# Altium footprint library mmyLibrary.PcbLib: 231 footprints (part 6 of 15)
Each footprint in its own frame and in the unit in brackets; x right, y up, seen from the top. Pads: shape width x height; smd on the part's side, far side on the other; paste and mask are expansions set on the pad; w line width, h text height; cw(c..) or ccw(c..) is an arc to the next point about the centre after c.
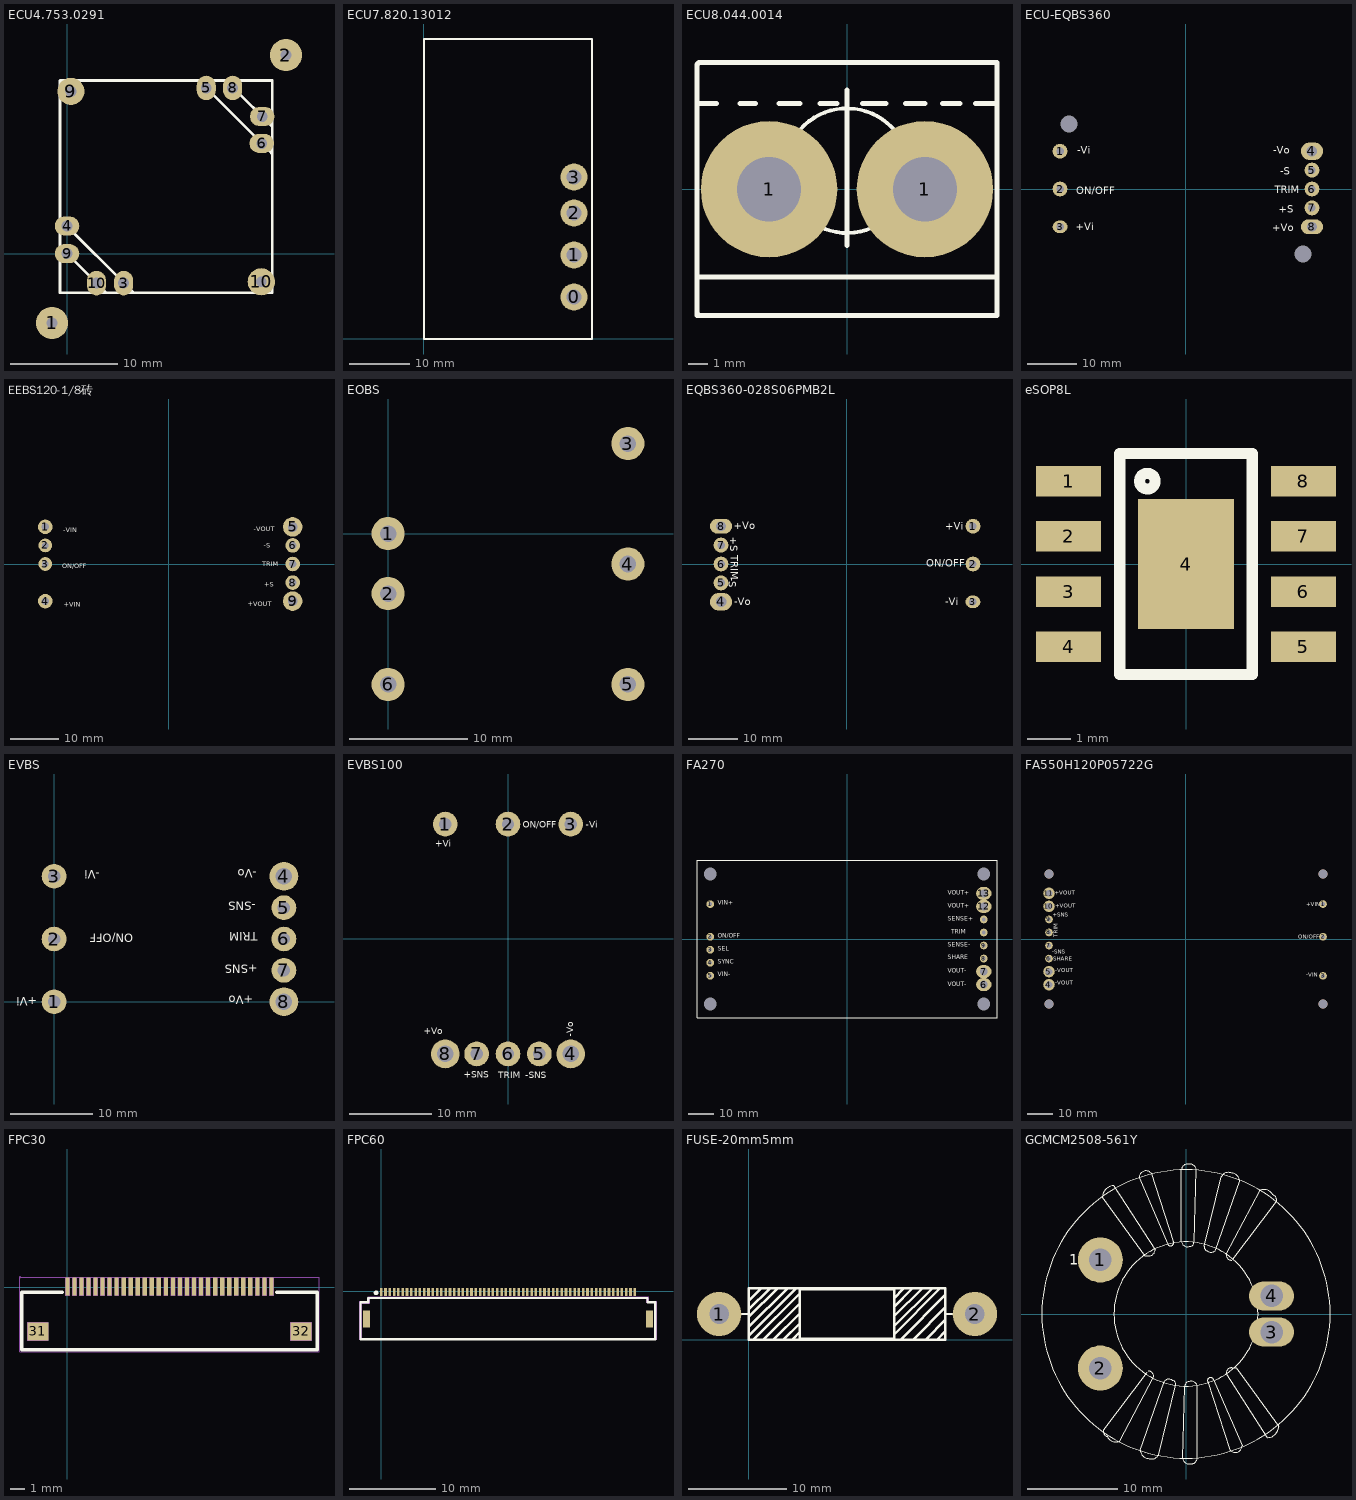
[diagram p5: the footprints below, top view; thin cyan lines are the x and y axes]

## ECU4.753.0291 [mil]
pads (12):
  round 118.11 hole 39.37: 1(-55,-255) 2(805,730)
  oval 70x90 hole 40: 3(208.33,-108.58) 5(511.98,609.13) 8(609.13,609.13) 10(108.5,-108.58)
  oval 90x70 hole 40: 4(0,101.6) 6(715.9,405.25) 7(717.67,504.12) 9(0,0)
  round 100 hole 40: 9(14.29,596.42) 10(714.29,-103.58)
Top Overlay:
  lines w10: -25.71,-24.53 -25.71,-23.98 ; -25.55,126.26 244.29,-143.58 244.53,-143.58 ; -23.98,23.9 143.5,-143.58 143.74,-143.58 ; 133.11,-143.58 133.11,-141.85 ; 484.73,636.42 751.19,369.96 754.29,369.96 ; 610.89,610.89 751.04,470.75 752.95,470.75 754.29,470.75 ; 752.8,373.5 754.29,373.5 ; 754.29,408.7 754.29,412.48 ; -25.71,-143.58 754.29,-143.58 754.29,636.42 -25.71,636.42 -25.71,-143.58

## ECU7.820.13012 [mm] "比拟在ECU7.820.12296中所占位置"
pads (4):
  round 4.5 hole 2.5: 0(25,7) 1(25,14) 2(25,21) 3(25,27)
Top Overlay:
  lines w0.254: 0,0 0,50 28,50 28,0 0,0

## ECU8.044.0014 [mm]
pads (2):
  round 7 hole 3.3: 1(-4,0) 1(4,0)
Top Overlay:
  circle w0.2: c0,0.95 r3.2
  lines w0.254: -7.7,-6.384 -7.6,-6.484 7.7,-6.484 ; -7.7,-4.5 7.7,-4.5 ; -7.7,-0.2 -7.7,-6.484 ; -7.7,3.8 -7.7,6.4 -7.6,6.5 7.7,6.5 7.7,-6.484 ; -7.7,4.4 -6.7,4.4 ; -7.7,4.5 -7.7,-6.484 ; -5.5,4.4 -4.7,4.4 ; -3.5,4.4 -2.4,4.4 ; -1.4,4.4 -0.5,4.4 ; 0,-2.9 0,5.1 ; 0.8,4.4 2,4.4 ; 3,4.4 4,4.4 ; 4.9,4.4 5.8,4.4 ; 6.6,4.4 7.7,4.4 ; 7.7,4.5 7.7,-6.484 ; -7.7,-6.484 7.7,-6.484

## ECU-EQBS360 [mm]
pads (10):
  round 0 hole 3.5: 0(-23.6,13.1) 0(23.6,-13.1)
  round 3 hole 1.5: 1(-25.4,7.62) 2(-25.4,0) 5(25.4,3.81) 6(25.4,0) 7(25.4,-3.81)
  oval 3x2.5 hole 1.5: 3(-25.4,-7.62)
  oval 4.5x3.5 hole 2.1: 4(25.4,7.62)
  oval 4.5x3 hole 2: 8(25.4,-7.62)
Top Overlay:
  text "+Vi" at -22.187,-8.34 h1.5
  text "+Vo" at 17.409,-8.494 h1.5
  text "+S" at 18.669,-4.826 h1.5
  text "TRIM" at 17.869,-0.877 h1.5
  text "-S" at 19.05,2.921 h1.5
  text "-Vo" at 17.636,7.067 h1.5
  text "-Vi" at -21.933,7.067 h1.5
  text "ON/OFF" at -22.098,-1.016 h1.5
Bottom Overlay:
  lines w0.254: -30.25,-19.4 30.25,-19.4 30.25,19.4 -30.25,19.4 -30.25,-19.4
  text "+Vi" at -18.687,-8.34 h1.5
  text "ON/OFF" at -15.621,-0.889 h1.5
  text "-Vi" at -18.433,7.167 h1.5
  text "-Vo" at 21.736,7.067 h1.5
  text "-S" at 21.679,2.866 h1.5
  text "TRIM" at 21.99,-0.727 h1.5
  text "+S" at 21.579,-4.801 h1.5
  text "+Vo" at 21.509,-8.494 h1.5

## EEBS120-1/8砖 [mm]
pads (9):
  round 3 hole 1.5: 1(-25.4,7.62) 4(-25.4,-7.62) 6(25.4,3.81) 7(25.4,0) 8(25.4,-3.81)
  round 2.8 hole 1.4: 2(-25.4,3.81) 3(-25.4,0)
  round 4 hole 2: 5(25.4,7.62) 9(25.4,-7.62)
Top Overlay:
  text "+VOUT" at 16.129,-8.636 h1
  text "-VOUT" at 17.399,6.731 h1
  text "-S" at 19.431,3.302 h1
  text "TRIM" at 19.177,-0.508 h1
  text "ON/OFF" at -21.885,-0.855 h1
  text "+VIN" at -21.653,-8.785 h1
  text "-VIN" at -21.725,6.565 h1
  text "+S" at 19.558,-4.699 h1
Bottom Overlay:
  lines w0.254: -30.8,-13.3 30.8,-13.3 30.8,13.3 -30.8,13.3 -30.8,-13.3
  text "+VOUT" at 21.756,-8.634 h1
  text "-VOUT" at 22.132,6.779 h1
  text "-S" at 21.351,3.261 h1
  text "TRIM" at 21.968,-0.671 h1
  text "ON/OFF" at -17.145,-0.762 h1
  text "-VIN" at -19.685,6.731 h1
  text "+VIN" at -18.415,-9.017 h1
  text "+S" at 21.46,-4.484 h1

## EOBS [mm]
pads (6):
  round 2.8 hole 1.4: 1(0,0) 2(0,-5.08) 3(20.3,7.62) 4(20.3,-2.58) 5(20.3,-12.78) 6(0,-12.78)
Bottom Overlay:
  lines w0.254: -2.55,-15.28 22.85,-15.28 22.85,10.12 -2.55,10.12 -2.55,-15.28
  text "-VIN" at 2.35,-4.58 h1
  text "ON/OFF" at 2.025,-12.18 h1
  text "+VIN" at 2.25,0.795 h1
  text "TRIM" at 14.075,-1.83 h1
  text "-VO" at 13.675,-12.23 h1
  text "+VO" at 13.975,8.47 h1

## EQBS360-028S06PMB2L [mm]
pads (8):
  round 3 hole 1.5: 1(25.4,7.62) 2(25.4,0) 5(-25.4,-3.81) 6(-25.4,0) 7(-25.4,3.81)
  oval 3x2.5 hole 1.5: 3(25.4,-7.62)
  oval 4.5x3.5 hole 2.1: 4(-25.4,-7.62)
  oval 4.5x3 hole 2: 8(-25.4,7.62)
Top Overlay:
  text "ON/OFF" at 15.95,-0.6 h1.5
  text "-Vi" at 19.85,-8.3 h1.5
  text "-Vo" at -22.75,-8.3 h1.5
  text "-S" at -23.813,-2.8 h1.5
  text "TRIM" at -23.413,1.8 h1.5
  text "+S" at -23.513,5.5 h1.5
  text "+Vo" at -22.85,7 h1.5
  text "+Vi" at 19.85,6.9 h1.5
Bottom Overlay:
  lines w0.254: -30.25,-19.4 -30.25,19.4 30.25,19.4 30.25,-19.4 -30.25,-19.4
  text "+Vo" at -18.75,7 h1.5
  text "+S" at -19.95,3.2 h1.5
  text "TRIM" at -18.65,-0.6 h1.5
  text "-S" at -19.85,-4.5 h1.5
  text "-Vo" at -18.65,-8.3 h1.5
  text "-Vi" at 23.35,-8.2 h1.5
  text "ON/OFF" at 23.25,-0.6 h1.5
  text "+Vi" at 23.35,6.9 h1.5

## eSOP8L [mm]
pads (9):
  rect 1.5x0.7 smd: 1(-2.7,1.905) 2(-2.7,0.635) 3(-2.7,-0.635) 4(-2.7,-1.905) 5(2.7,-1.905) 6(2.7,-0.635) 7(2.7,0.635) 8(2.7,1.905)
  rect 2.2x3 smd: 4(0,0)
Top Overlay:
  circle w0.254: c-0.889,1.905 r0.18
  lines w0.254: -1.524,-2.54 -1.524,2.54 1.524,2.54 1.524,-2.54 -1.524,-2.54

## EVBS [mm]
pads (8):
  round 3 hole 1.5: 1(0,0) 2(0,7.62) 3(0,15.24) 5(27.94,11.43) 6(27.94,7.62) 7(27.94,3.81)
  round 3.5 hole 2: 4(27.94,15.24) 8(27.94,0)
Top Overlay:
  text "+Vi" at -2.03,0.55 h1
  text "+Vo" at 24.2,0.72 h1
  text "+SNS" at 24.75,4.48 h1
  text "TRIM" at 24.73,8.42 h1
  text "-SNS" at 24.52,12.17 h1
  text "-Vo" at 24.65,16.11 h1
  text "ON/OFF" at 9.635,8.26 h1
  text "-Vi" at 5.535,15.96 h1
Bottom Overlay:
  lines w0.254: -4.265,-5.54 -4.265,20.78 32.205,20.78 32.205,-5.54 -4.265,-5.54
  text "-Vi" at 2.135,15.96 h1
  text "ON/OFF" at 2.135,8.26 h1
  text "+Vi" at 2.035,0.76 h1
  text "-Vo" at 21.635,15.96 h1
  text "-SNS" at 20.435,12.16 h1
  text "TRIM" at 21.735,8.36 h1
  text "+SNS" at 20.435,4.56 h1
  text "+Vo" at 21.535,0.86 h1

## EVBS100 [mm]
pads (8):
  round 3 hole 1.5: 1(-7.62,13.97) 2(0,13.97) 3(7.62,13.97) 5(3.81,-13.97) 6(0,-13.97) 7(-3.81,-13.97)
  round 3.5 hole 2: 4(7.62,-13.97) 8(-7.62,-13.97)
Top Overlay:
  text "-Vi" at 9.432,13.502 h0.8
  text "ON/OFF" at 1.812,13.502 h0.8
  text "-Vo" at 7.908,-11.898 h0.8
  text "-SNS" at 2.127,-16.905 h0.8
  text "TRIM" at -1.175,-16.956 h0.8
  text "+SNS" at -5.366,-16.854 h0.8
  text "+Vo" at -10.243,-11.571 h0.8
  text "+Vi" at -8.856,11.216 h0.8
Bottom Overlay:
  lines w0.254: -13.16,-18.235 -13.16,18.235 13.16,18.235 13.16,-18.235 -13.16,-18.235
  text "+Vo" at -6.28,-11.419 h0.8
  text "+SNS" at -2.318,-11.698 h0.8
  text "TRIM" at 1.05,-11.39 h0.8
  text "-SNS" at 5.368,-11.39 h0.8
  text "-Vo" at 8.67,-11.39 h0.8
  text "+Vi" at -6.57,10.962 h0.8
  text "ON/OFF" at 1.558,10.962 h0.8
  text "-Vi" at 8.67,10.962 h0.8

## FA270 [mm]
pads (17):
  round 0 hole 5: 0(-53.34,25.4) 1(-53.34,-25.4) 2(53.34,-25.4) 3(53.34,25.4)
  round 3 hole 1.5: 1(-53.34,13.59) 2(-53.34,0.89) 3(-53.34,-4.19) 4(-53.34,-9.27) 5(-53.34,-14.35) 8(53.34,-7.62) 9(53.34,-2.54) 10(53.34,2.54) 11(53.34,7.62)
  oval 6x5 hole 3: 6(53.34,-17.78) 7(53.34,-12.7) 12(53.34,12.7) 13(53.34,17.78)
Top Overlay:
  lines w0.127: -58.5,-30.75 -58.5,30.75 58.5,30.75 58.5,-30.75 -58.5,-30.75
  text "VIN+" at -50.419,12.7 h3
  text "ON/OFF" at -50.419,0 h3
  text "SEL" at -50.419,-5.207 h3
  text "SYNC" at -50.419,-10.287 h3
  text "VIN-" at -50.419,-15.113 h3
  text "VOUT-" at 39.37,-19.05 h3
  text "VOUT-" at 39.37,-13.716 h3
  text "SHARE" at 39.37,-8.509 h3
  text "SENSE-" at 39.37,-3.556 h3
  text "TRIM" at 40.64,1.524 h3
  text "SENSE+" at 39.37,6.604 h3
  text "VOUT+" at 39.37,11.684 h3
  text "VOUT+" at 39.37,16.764 h3

## FA550H120P05722G [mm]
pads (11):
  round 3 hole 1.5: 1(53.34,13.59) 2(53.34,0.89) 3(53.34,-14.35) 6(-53.34,-7.62) 7(-53.34,-2.54) 8(-53.34,2.54) 9(-53.34,7.62)
  round 4.5 hole 2.6: 4(-53.34,-17.78) 5(-53.34,-12.7) 10(-53.34,12.7) 11(-53.34,17.78)
via 53.34,25.4 diameter 3.5 hole 3.5
via 53.34,-25.4 diameter 3.5 hole 3.5
via -53.34,25.4 diameter 3.5 hole 3.5
via -53.34,-25.4 diameter 3.5 hole 3.5
Top Overlay:
  text "ON/OFF" at 43.795,0.007 h1.5
  text "+VOUT" at -51.074,17.279 h1.5
  text "+SNS" at -51.836,8.643 h1.5
  text "TRIM" at -49.931,0.642 h1.5
  text "-SNS" at -52.09,-5.708 h1.5
  text "-VOUT" at -50.947,-17.9 h1.5
  text "-VIN" at 46.843,-14.725 h1.5
  text "+VIN" at 46.843,12.834 h1.5
  text "SHARE" at -51.709,-8.375 h1.5
  text "-VOUT" at -50.947,-12.947 h1.5
  text "+VOUT" at -50.82,12.199 h1.5
Bottom Overlay:
  lines w0.254: -58.4,-30.6 -58.4,30.6 58.4,30.6 58.4,-30.6 -58.4,-30.6
  text "-VOUT" at -44.215,-17.901 h1.5
  text "-SNS" at -46.446,-5.581 h1.5
  text "TRIM" at -51.455,0.642 h1.5
  text "+SNS" at -46.375,8.643 h1.5
  text "+VOUT" at -44.216,17.152 h1.5
  text "-VIN" at 51.161,-14.852 h1.5
  text "+VIN" at 51.288,12.961 h1.5
  text "ON/OFF" at 51.415,0.007 h1.5
  text "SHARE" at -45.359,-8.375 h1.5
  text "-VOUT" at -44.215,-13.075 h1.5
  text "+VOUT" at -44.089,12.072 h1.5

## FPC30 [mil]
pads (32):
  rect 11.8x51.2 smd mask+2: 1(0.4,2.2) 2(20,2.2) 3(39.7,2.2) 4(59.3,2.2) 5(79,2.2) 6(98.7,2.2) 7(118.4,2.2) 8(138.1,2.2) 9(157.8,2.2) 10(177.5,2.2) 11(197.1,2.2) 12(216.8,2.2) 13(236.5,2.2) 14(256.2,2.2) 15(275.9,2.2) 16(295.6,2.2) 17(315.3,2.2) 18(334.9,2.2) 19(354.6,2.2) 20(374.3,2.2) 21(394,2.2) 22(413.8,2.2) 23(433.4,2.2) 24(453,2.2) 25(472.7,2.2) 26(492.4,2.2) 27(512.1,2.2) 28(531.8,2.2) 29(551.5,2.2) 30(571.2,2.2)
  rect 59.1x51.2 smd mask+2: 31(-82.3,-123.8) 32(653.9,-123.8)
Top Overlay:
  lines w10: -14.6,-13.6 -127.6,-13.6 -127.6,-175 699.2,-175 699.2,-13.6 586.2,-13.6
Mechanical 15:
  drawing of 37 lines, arcs and shapes, not listed

## FPC60 [mm]
pads (62):
  rect 0.3x0.9 smd: 1(0.01,-0.088) 2(0.51,-0.088) 3(1.01,-0.088) 4(1.51,-0.088) 5(2.01,-0.088) 6(2.51,-0.088) 7(3.01,-0.088) 8(3.51,-0.088) 9(4.01,-0.088) 10(4.51,-0.088) 11(5.01,-0.088) 12(5.51,-0.088) 13(6.01,-0.088) 14(6.51,-0.088) 15(7.01,-0.088) 16(7.51,-0.088) 17(8.01,-0.088) 18(8.51,-0.088) 19(9.01,-0.088) 20(9.51,-0.088) 21(10.01,-0.088) 22(10.51,-0.088) 23(11.01,-0.088) 24(11.51,-0.088) 25(12.01,-0.088) 26(12.51,-0.088) 27(13.01,-0.088) 28(13.51,-0.088) 29(14.01,-0.088) 30(14.51,-0.088) 31(15.01,-0.088) 32(15.51,-0.088) 33(16.01,-0.088) 34(16.51,-0.088) 35(17.01,-0.088) 36(17.51,-0.088) 37(18.01,-0.088) 38(18.51,-0.088) 39(19.01,-0.088) 40(19.51,-0.088) 41(20.01,-0.088) 42(20.51,-0.088) 43(21.01,-0.088) 44(21.51,-0.088) 45(22.01,-0.088) 46(22.51,-0.088) 47(23.01,-0.088) 48(23.51,-0.088) 49(24.01,-0.088) 50(24.51,-0.088) 51(25.01,-0.088) 52(25.51,-0.088) 53(26.01,-0.088) 54(26.51,-0.088) 55(27.01,-0.088) 56(27.51,-0.088) 57(28.01,-0.088) 58(28.51,-0.088) 59(29.01,-0.088) 60(29.51,-0.088)
  rect 0.8x2 smd: 61(31.21,-3.238) 62(-1.69,-3.238)
Top Overlay:
  circle w0.254: c-0.59,-0.188 r0.141
  lines w0.254: 30,-0.774 31,-0.774 31,-1.274 31.9,-1.274 31.9,-5.574 ; 30.01,-0.788 -0.49,-0.788 -1.49,-0.788 -1.49,-1.288 -2.39,-1.288 -2.39,-5.588 31.91,-5.588
Mechanical 15:
  region: -2.54,-5.663 -2.54,-1.463 -2.24,-1.463 -2.24,-5.463 31.86,-5.463 31.86,-1.363 30.86,-1.363 30.86,-0.863 -1.34,-0.863 -1.34,-1.463 -2.24,-1.463 -2.54,-1.463 -2.54,-1.163 -1.54,-1.163 -1.54,-0.663 31.16,-0.663 31.16,-1.163 32.06,-1.163 32.06,-5.663

## FUSE-20mm5mm [mm] "20mm5mm"
height 5
pads (2):
  round 4.5 hole 2: 1(-3,2.6) 2(23,2.6)
Top Overlay:
  lines w0.254: -3,2.6 -0.06,2.6 ; 0,0.381 4.826,5.2 ; 0,1.27 3.937,5.2 ; 0,2.286 2.921,5.2 ; 0,3.048 2.159,5.2 ; 0,3.937 1.27,5.2 ; 0.508,0 5.2,4.699 ; 1.524,0 5.2,3.683 ; 2.54,0 5.2,2.667 ; 3.556,0 5.2,1.651 ; 4.445,0 5.2,0.762 ; 5.2,0 5.2,5.2 ; 5.2,0.1 14.8,0.1 ; 5.2,5.1 14.8,5.1 ; 14.8,0 14.8,5.2 ; 14.8,0.508 19.431,5.2 ; 14.8,1.397 18.669,5.2 ; 14.8,2.413 17.653,5.2 ; 14.8,3.302 16.637,5.2 ; 14.8,4.191 15.748,5.2 ; 15.494,0 20,4.572 ; 16.764,0 20,3.302 ; 18.034,0 20,2.032 ; 19.177,0 20,0.889 ; 20.06,2.6 23,2.6 ; 0,0 0,5.2 20,5.2 20,0 0,0

## GCMCM2508-561Y [mm]
pads (4):
  round 5 hole 2.5: 1(-9.5,6) 2(-9.5,-6)
  oval 5x3.2 hole 2.5: 3(9.5,-2) 4(9.5,2)
Top Overlay:
  circle w0.127: c0,0 r8
  circle w0.127: c0,0 r16
  lines w0.127: -4.318,-6.477 -9.144,-12.827 ccw(c-8.572,-13.018) -8.763,-13.589 ccw(c-7.81,-13.144) -7.366,-14.097 -3.556,-6.985 ccw(c-4.191,-6.985) -4.191,-6.35 ; 5.08,5.969 cw(c5.08,6.604) 4.445,6.604 8.255,13.716 cw(c8.7,12.763) 9.652,13.208 cw(c9.461,12.636) 10.033,12.446 5.207,6.096 ; -9.271,12.954 cw(c-8.001,12.954) -8.001,14.224 -3.429,7.112 cw(c-4.064,7.112) -4.064,6.477 -4.572,6.477 -9.271,12.954 ; -5.207,15.113 cw(c-4.445,15.113) -3.86,15.601 -1.397,8.001 cw(c-1.651,7.874) -1.524,7.62 cw(c-1.714,7.938) -2.032,7.747 -5.207,15.113 ; -5.08,-15.113 ccw(c-4.191,-15.113) -4.191,-16.002 ccw(c-3.81,-15.24) -3.048,-15.621 -1.143,-7.874 ccw(c-1.587,-7.81) -1.524,-7.366 ccw(c-1.905,-7.874) -2.413,-7.493 -5.08,-15.113 ; -0.508,8.001 ccw(c0.19,8.191) 0.381,7.493 ccw(c0.381,8.001) 0.889,8.001 1.143,16.002 ccw(c0.381,15.875) 0.254,16.637 ccw(c0.191,15.938) -0.508,16.002 -0.508,8.001 ; -0.381,-16.002 ccw(c0.381,-15.875) 0.508,-16.637 ccw(c0.572,-15.938) 1.27,-16.002 1.27,-8.001 ccw(c0.572,-8.191) 0.381,-7.493 ccw(c0.381,-8.001) -0.127,-8.001 -0.381,-16.002 ; 2.032,7.493 ccw(c2.476,7.429) 2.413,6.985 ccw(c2.794,7.493) 3.302,7.112 5.969,14.732 ccw(c5.08,14.732) 5.08,15.621 ccw(c4.699,14.859) 3.937,15.24 2.032,7.493 ; 2.413,-7.493 cw(c2.667,-7.366) 2.54,-7.112 cw(c2.73,-7.43) 3.048,-7.239 6.223,-14.605 cw(c5.461,-14.605) 4.876,-15.093 2.413,-7.493 ; 4.445,-6.604 cw(c5.08,-6.604) 5.08,-5.969 5.588,-5.969 10.287,-12.446 cw(c9.017,-12.446) 9.017,-13.716 4.445,-6.604
  text "1" at -12.954,5.08 h2